# Altium integrated library HamedLib.IntLib: 365 symbols (part 3 of 3)
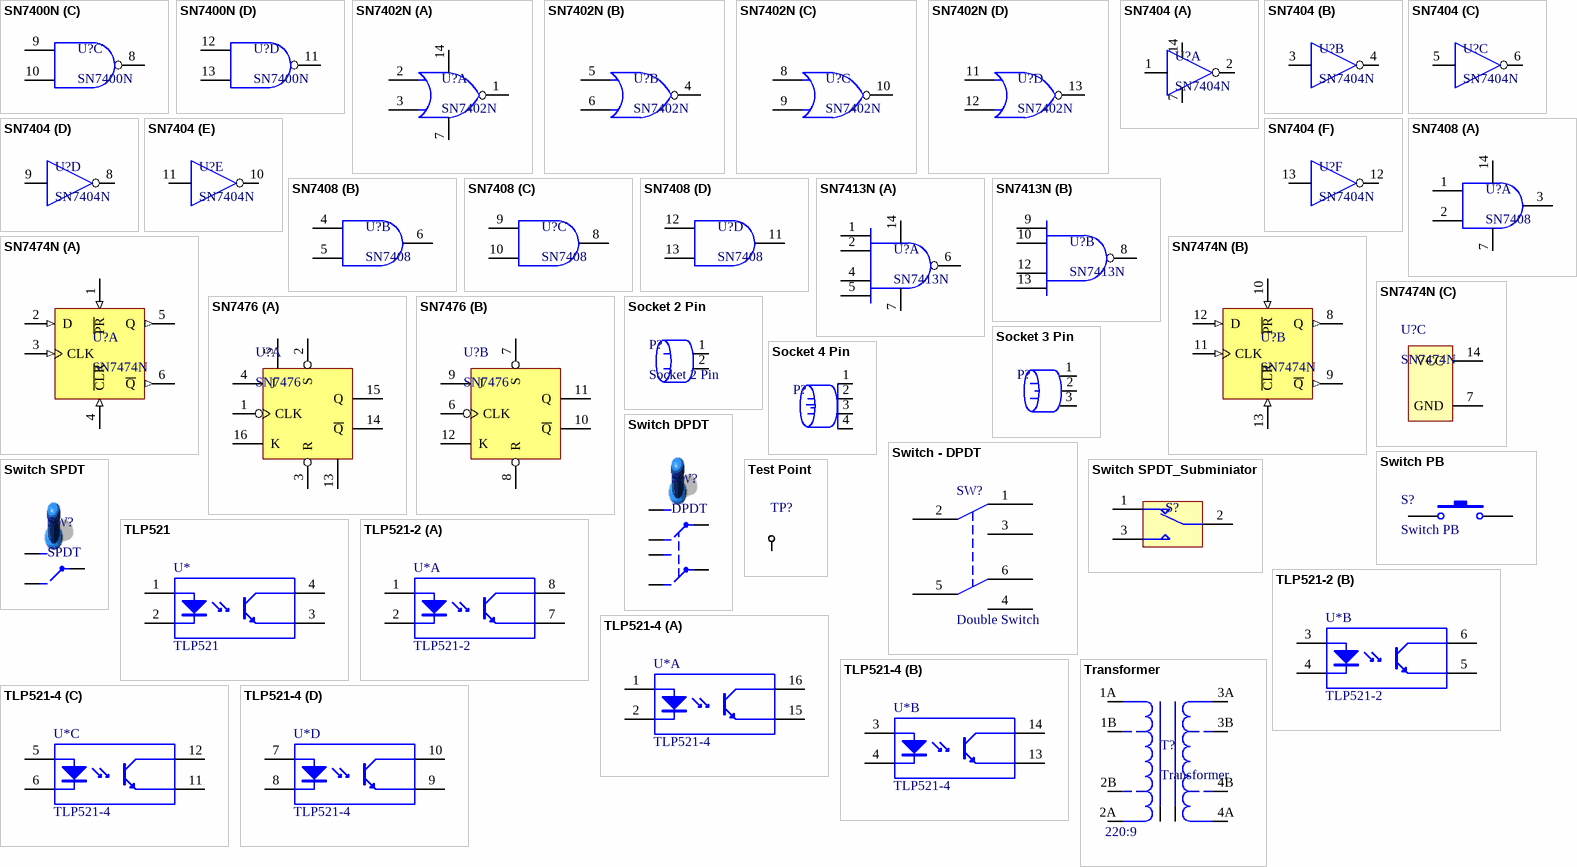
[diagram p20: symbols SN7400N to Transformer]

## SN7400N
designator U?
Quad 2 Input NAND Gate; Manufacturer: Texas Instrument; Designer: Saeid Jorablo; Company: ControTec; Adding date: 1387/12/22; ComponentLink1Description: DataSheet; ComponentLink1URL: *; Reversion: *
footprint DIP14
part A pins: 1, 2, 3, 7 GND (power), 14 VCC (power)
part B pins: 4, 5, 6
part C pins: 8, 9, 10
part D pins: 11, 12, 13

## SN7402N
designator U?
Quad 2 Input NOR Gate; Manufacturer: Texas Instrument; Designer: Saeid Jorablo; Company: ControTec; Adding Date: 1387/12/22; ComponentLink1Description: DataSheet; ComponentLink1URL: *
footprint DIP14
part A pins: 1, 2, 3, 7 GND, 14 VCC
part B pins: 4, 5, 6
part C pins: 8, 9, 10
part D pins: 11, 12, 13

## SN7404
designator U?, comment SN7404N
Hex Inverter; Manufactorer: Texas Instrument; Designer: Saeid Jorablo; Company: ControTec; Adding Date: 1387/12/22; ComponentLink1Description: Data Sheet; ComponentLink1URL: *
footprint dip14
part A pins: 1, 2, 7 GND (power), 14 VCC (power)
part B pins: 3, 4
part C pins: 5, 6
part D pins: 8, 9
part E pins: 10, 11
part F pins: 12, 13

## SN7408
designator U?
Quad 2 Input AND Gate; Designer: Saeid Jorablo; Company: ControTEK; Adding Date: 1387/01/10
footprint dip14
part A pins: 1, 2, 3, 7 GND (power), 14 VCC (power)
part B pins: 4, 5, 6
part C pins: 8, 9, 10
part D pins: 11, 12, 13

## SN7413N
designator U?
Dual 4 Input NAND Gate; Manufacturer: Texas Instrument; Designer: Saeid Jorablo; Company: ControTec; Adding Date: 1387/12/12; ComponentLink1Description: Data Sheet; ComponentLink1URL: *
footprint DIP14
part A pins: 1, 2, 4, 5, 6, 7 GND, 14 VCC
part B pins: 8, 9, 10, 12, 13

## SN7474N
designator U?
Dual D Flip Flop; Manufactorer: Texas Instrument; Designer: Saeid Jorablo; Company: ControTec; Adding Date: 1387/12/22; ComponentLink1Description: Data Sheet; ComponentLink1URL: *
footprint dip14
part A pins: 1 ~{PR} (in), 2 D (in), 3 CLK (in), 4 ~{CLR} (in), 5 Q (out), 6 ~{Q} (out)
part B pins: 8 Q (out), 9 ~{Q} (out), 10 ~{PR} (in), 11 CLK (in), 12 D (in), 13 ~{CLR} (in)
part C pins: 7 GND (power), 14 VCC (power)

## SN7476
designator U?
Dual J-K Flip Flop With Set & Reset; Designer: Saeid Jorablo; Company: ControTEK; Adding Date: 1387/01/10
footprint Dip16 (Footprint not found)
signal-integrity model SN7476 (Dual J-K Flip Flop)
part A pins: 1 CLK, 2 S, 3 R, 4 J, 5 VCC (power), 13 GND (power), 14 ~{Q}, 15 Q, 16 K
part B pins: 6 CLK, 7 S, 8 R, 9 J, 10 ~{Q}, 11 Q, 12 K

## Socket 2 Pin
designator P?
Power Input
footprint 2pin
pins: 1, 2

## Socket 3 Pin
designator P?  (value not drawn)
Power Input
footprint 3PIN
pins: 1, 2, 3

## Socket 4 Pin
designator P?  (value not drawn)
Power Input
footprint 4pin
pins: 1, 2, 3, 4

## Switch - DPDT
designator SW?, comment Double Switch
DPDT Switch
footprint Switch - DPDT
pins: 1, 2, 3, 4, 5, 6

## Switch DPDT
designator SW?, comment DPDT
DPDT Switch
footprint header 3x2
pins: 1, 2, 3, 4, 5, 6

## Switch PB
designator S?
Push Button Switch
footprint Switch - Push to On
footprint SW-PB
pins: 1, 2

## Switch SPDT
designator SW?, comment SPDT
SPDT Switch; Designer: Saeid Jorablo; Company: ControTEK; Adding Date: 1387/01/10
footprint SW SPDT- Horizontal
footprint Switch SPDT - 500x270x1100x185 mil
footprint Switch SPDT - 500x270x1100x185 mil - Right Angle
pins: 1, 2, 3

## Switch SPDT_Subminiator
designator S?  (value not drawn)
Subminiator SPDT Switch; Company: E.P.I.L; Design date: 2011/11/02
footprint SPDT Subminiator (Subminiator SPDT switch)
pins: 1, 2, 3

## Test Point
designator TP?  (value not drawn)
footprint Test Point
footprint Test Point Small
footprint Test_Pin
pins: 1 T

## TLP521
designator U*
HIGH DENSITY MOUNTING PHOTOTRANSISTOR OPTICALLY COUPLED ISOLATORS; Company: IPA Co.; Creator: Saeid Jorablo; Creation Date: 1387-1-26
pins: 1 A, 2 K, 3 E, 4 C

## TLP521-2
designator U*
HIGH DENSITY MOUNTING PHOTOTRANSISTOR OPTICALLY COUPLED ISOLATORS; Company: IPA CO.; Creator: Saeid Jorablo; Creation Date: 1387-1-26
footprint DIP8
part A pins: 1 A, 2 K, 7 E, 8 C
part B pins: 3 A, 4 K, 5 E, 6 C

## TLP521-4
designator U*
HIGH DENSITY MOUNTING PHOTOTRANSISTOR OPTICALLY COUPLED ISOLATORS; Company: IPA CO.; Creator: Saeid Jorablo; Creation Date: 1387-1-26; ComponentLink1Description: datasheet - pdf; ComponentLink1URL: *; ComponentLink2Description: appnote
footprint DIP16
part A pins: 1 A, 2 K, 15 E, 16 C
part B pins: 3 A, 4 K, 13 E, 14 C
part C pins: 5 A, 6 K, 11 E, 12 C
part D pins: 7 A, 8 K, 9 E, 10 C

## Transformer
designator T?  Voltage Ratio: 220:9
Designer: Eng. Saeid Jorablo; Company: DASE CO; Power: 100W; Adding Date: 10/27/2010
footprint Trans- Small
pins: 1A, 1B, 2A, 2B, 3A, 3B, 4A, 4B, SA, SB

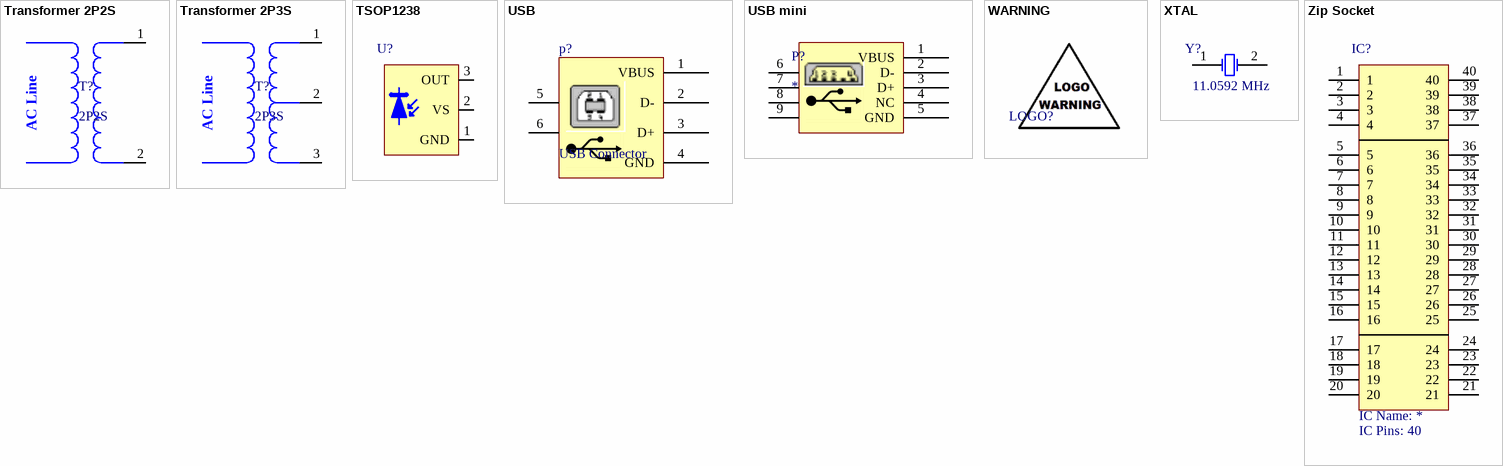
[diagram p13: symbols Transformer 2P2S to Zip Socket]

## Transformer 2P2S
designator T?, comment 2P2S
Transformer 2 Primary , 2 Secondry; Designer: Saeid jorablo; Company: ControTEK; Voltage Ratio: 220:9; Power: 100W; Adding Date: 1387/01/22
footprint Socket Blue 2
pins: 1, 2
text: AC Line

## Transformer 2P3S
designator T?, comment 2P3S
Transformer 2 Primary , 3 Secondry; Designer: Saeid Jorablo; Company: ControTEK; Voltage Ratio: 220:9; Power: 72W; Adding Date: 1387/01/22
footprint Socket Blue 3
pins: 1, 2, 3
text: AC Line

## TSOP1238
designator U?  (value not drawn)
Photo Modules for PCM Remote Control Systems; Frequency: 38 KHz; Designer: Saeid Jorablo; Company: IPA CO; Voltage: 5 V; Power: 50 mW; Adding Date: 1388/04/06
footprint TSOP1238 (IR Sensor (TV Sensor))
pins: 1 GND, 2 VS, 3 OUT

## USB
designator p?, comment USB Connector
USB Connector-B Type; Designer: Eng. Saeid Jorablo; Company: DASE Co; Adding Date: 10/26/2010
footprint USB2.5-2H4D (Connector; USB1.1, Type B, Thru-Hole; 4 Position; Right Angle)
footprint USB2.5-2H4E (Connector; USB1.1, Type B, Thru-Hole; 4 Position; Right Angle)
footprint USB2.5-2H4F (Connector; USB1.1, Type B, Thru-Hole; 4 Position; Right Angle)
footprint USB2.5-2H4G (Connector; USB1.1, Type B, Thru-Hole; 4 Position; Right Angle)
footprint USB2.5-2V4 (Connector; USB1.1, Type B, Thru-Hole; 4 Position; Vertical)
footprint USB2.5-4V4 (Connector; USB1.1, Type B, Thru-Hole; 4 Position; Vertical)
footprint USB/SM1.25-4H4 (Connector; USB1.1, Type B, SM; 4 Position; Right Angle)
pins: 1 VBUS (power), 2 D-, 3 D+, 4 GND (power), 5, 6

## USB mini
designator P?
mini USB Connector
footprint mini USB Connector
footprint SMD_Mini USB Connector
footprint USB/SM0.8-6H5 (Connector; USB2.0, Type B, SM; 5 Position; Right Angle)
pins: 1 VBUS (power), 2 D-, 3 D+, 4 NC (power), 5 GND (power), 6, 7, 8, 9

## WARNING
designator LOGO?, comment Warning!  (value not drawn)  (no BOM)
WARNING & LOGO; Company: E.P.I.L; Design Date: 11/6/2011; Value: Warning!
footprint LOGO SPEAKER
footprint LOGO USB
footprint WARNING
footprint WARNING ESD
footprint LOGO RESET
footprint LOGO Saeid

## XTAL
designator Y?, comment 11.0592 MHz
XTAL Crystal; Company: E.P.I.L; Design Date: 11/04/2011; Value: 11.0592 MHz
footprint Crystal SMD
footprint XTAL
footprint XTAL Small
footprint XTAL RTC
pins: 1 OSC1, 2 OSC2

## Zip Socket
designator IC?  IC Pins: 40  (hidden comment: Zip Socket)
40pin Zip/Zif Socket; Company: ECI CO.; Adding Date: 11/25/2011; IC Name: *
footprint DIP40 - Zip Socket
pins: 1, 2, 3, 4, 5, 6, 7, 8, 9, 10, 11, 12, 13, 14, 15, 16, 17, 18, 19, 20, 21, 22, 23, 24, 25, 26, 27, 28, 29, 30, 31, 32, 33, 34, 35, 36, 37, 38, 39, 40


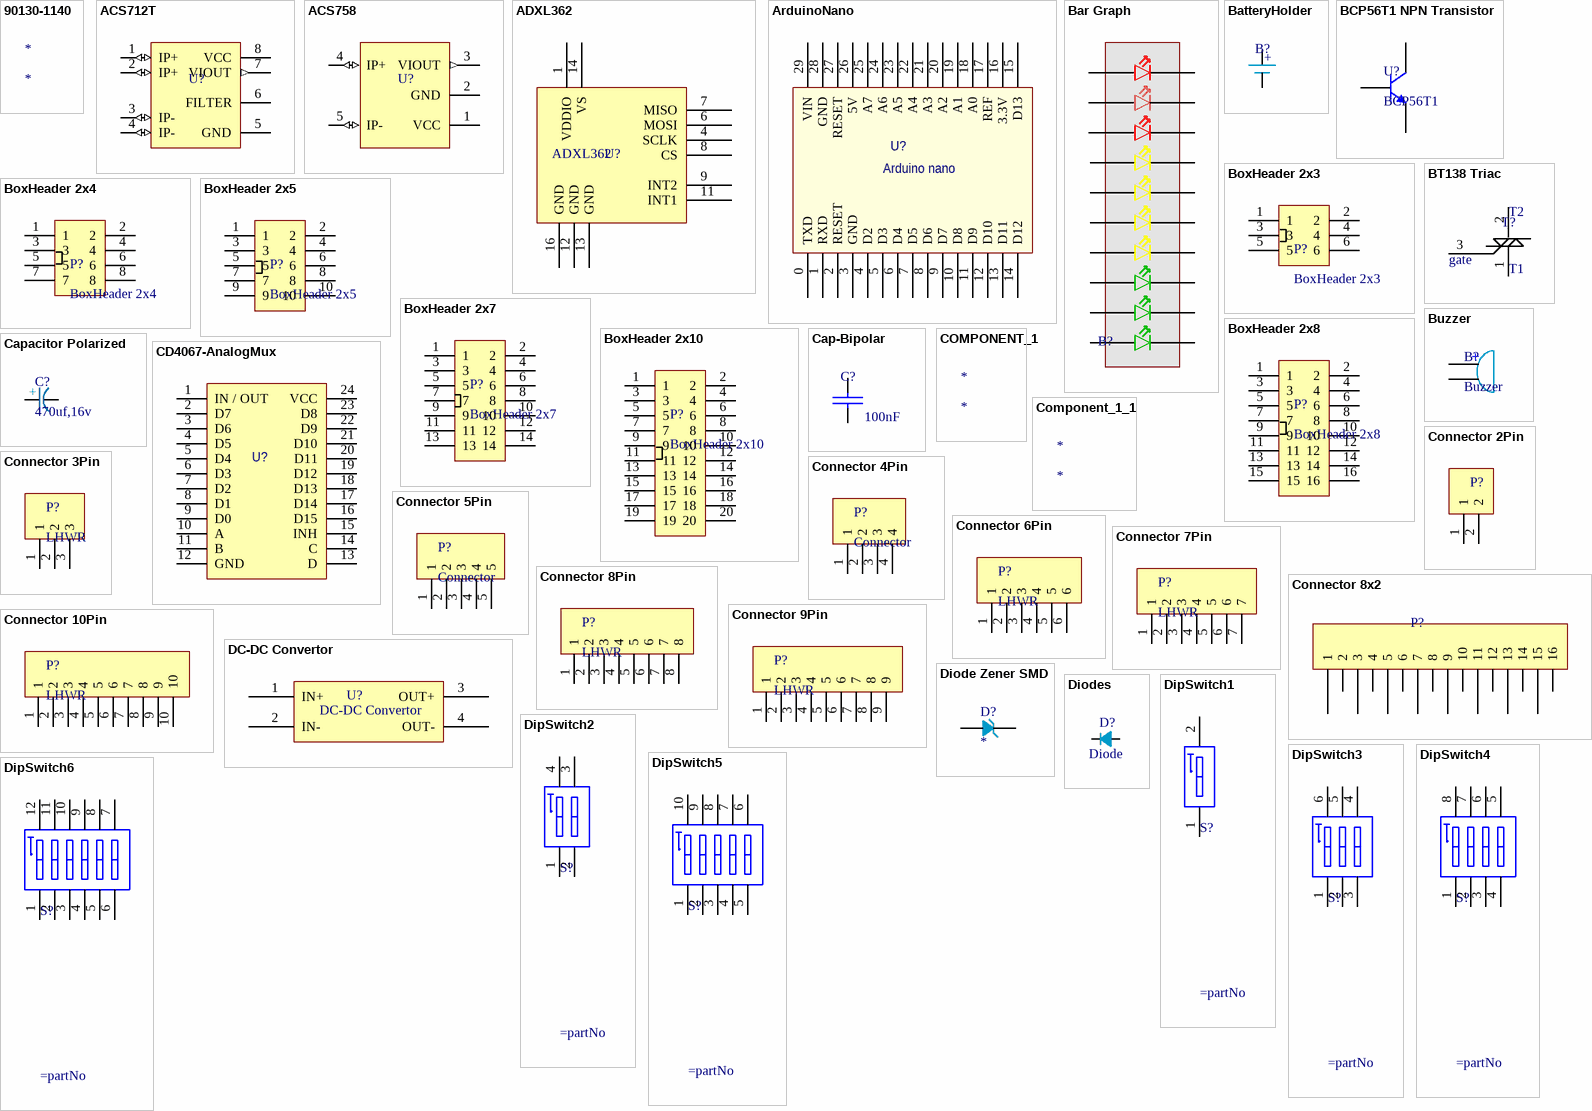
[diagram p14: symbols 90130-1140 to DipSwitch6]

## 90130-1140
designator *
Board Connector, 40 Contact(s), 2 Row(s), Male, Straight, 0.1 inch Pitch, Solder Terminal, Locking, Black Insulator, Receptacle; Manufacturer: Molex; Manufacturer Part Number: 90130-1140; Manufacturer Series: 90130; Option: General Purpose; Filter Feature: No; Number of Contacts: 40; Contact Pattern: RECTANGULAR; Dielectric Withstanding Voltage (AC): 700V; Insulation Resistance: 5GR; Number Of Connectors: 1; Number Of PCB Rows: 2; Rated Current (Signal): 3A; Contact Resistance: 20mR; Durability: 500Cycles; Contact Style: SQ PIN-SKT; Insertion Force-Max: 3.0024N; Body Breadth: 0.384inch; Body Depth: 0.515inch; PCB Contact Row Spacing: 2.54mm; Plating Thickness: 118uin; Body Length: 2.092inch; Reference Standard: UL; Reliability: COMMERCIAL; Supplier: Mouser; Supplier Part Number: 538-90130-1140; RoHS: Yes; Category: Headers and Wire Housings; Stock: 1491; Pricing: 1=3.06, 10=2.61, 50=2.28, 100=2.28, 1000=2.28, 10000=2.28 (USD); Mounting Technology: Board; Contact Finish - Mating: NOT SPECIFIED; Contact Material: Copper Alloy; Insulation Material: Glass; Insulation Color: Black; Min Operating Temperature: -55°C; Max Operating Temperature: 125°C; Connector Type: BOARD CONNECTOR; Contact Gender: Male; Mixed Contacts: No; Termination: Solder; Mounting Style: STRAIGHT; Number of Rows Loaded: 2; PCB Contact Pattern: RECTANGULAR; Body/Shell Style: RECEPTACLE; Mating Contact Pitch: 0.1inch; Terminal Pitch: 2.54mm; Mounting Option 1: LOCKING; Mating Contact Row Spacing: 0.1inch; Terminal Length: 0.114inch; Flammability Rating: UL94 V-0; DIN Conformance: No; IEC Conformance: No; MIL Conformance: No; Reach SVHC Compliant: Yes; RoHS Compliant: Yes; ComponentLink1URL: https://datasheet.ciiva.com:443/pdfs/VipMasterIC/IC/MOLE/MOLE-S-A0001360181/MOLE-S-A0001366101-1.pdf?src-supplier=IHS+Markit; ComponentLink1Description: https://datasheet.ciiva.com:443/pdfs/VipMasterIC/IC/MOLE/MOLE-S-A0001360181/MOLE-S-A0001366101-1.pdf?src-supplier=IHS+Markit; ComponentLink2URL: https://datasheet.ciiva.com/712/901301108-sd-712105.pdf?src-supplier=Digikey; ComponentLink2Description: https://datasheet.ciiva.com/712/901301108-sd-712105.pdf?src-supplier=Digikey; ComponentLink3URL: https://datasheet.ciiva.com/5155/0901301140-pcb-headers-151559-5155813.pdf?src-supplier=Mouser; ComponentLink3Description: https://datasheet.ciiva.com/5155/0901301140-pcb-headers-151559-5155813.pdf?src-supplier=Mouser; ComponentLink4URL: https://datasheet.ciiva.com/11752/0900766b80d6024d-11752755.pdf?src-supplier=Rs; ComponentLink4Description: https://datasheet.ciiva.com/11752/0900766b80d6024d-11752755.pdf?src-supplier=Rs; ComponentLink5URL: https://datasheet.ciiva.com/30129/0901301140-pcb-headers-30129574.pdf?src-supplier=Onlinecomponents.com; ComponentLink5Description: https://datasheet.ciiva.com/30129/0901301140-pcb-headers-30129574.pdf?src-supplier=Onlinecomponents.com; ComponentLink6URL: https://datasheet.ciiva.com/10072/0901301140-pcb-headers-10072277.pdf?src-supplier=Avnet; ComponentLink6Description: https://datasheet.ciiva.com/10072/0901301140-pcb-headers-10072277.pdf?src-supplier=Avnet

## ACS712T
designator U?  (value not drawn)
High-Precision Bidirectional Current sensor; Designer:: Hamed Jafarzadeh
footprint SOIC-8
pins: 1 IP+ (io) "Terminals for current being sampled; fused internally", 2 IP+ (io) "Terminals for current being sampled; fused internally", 3 IP- (io) "Terminals for current being sampled; fused internally", 4 IP- (io) "Terminals for current being sampled; fused internally", 5 GND (power) "Signal ground terminal", 6 FILTER "Terminal for external capacitor that sets bandwidth", 7 VIOUT (out) "Analog output signal", 8 VCC (power) "Device power supply terminal"

## ACS758
designator U?  (value not drawn)
High-Precision Bidirectional Current sensor; Designer:: Hamed Jafarzadeh
footprint ACS758
pins: 1 VCC (power) "Device power supply terminal", 2 GND (power) "Signal ground terminal", 3 VIOUT (out) "Analog output signal", 4 IP+ (io) "Terminals for current being sampled; fused internally", 5 IP- (io) "Terminals for current being sampled; fused internally"

## ADXL362
designator U?  (value not drawn)
footprint ADXL362
pins: 1 VDDIO, 4 SCLK, 6 MOSI, 7 MISO, 8 CS, 9 INT2, 11 INT1, 12 GND, 13 GND, 14 VS, 16 GND

## ArduinoNano
designator U?  (value not drawn)
footprint ArduinoNano
pins: 0 TXD, 1 RXD, 2 RESET, 3 GND, 4 D2, 5 D3, 6 D4, 7 D5, 8 D6, 9 D7, 10 D8, 11 D9, 12 D10, 13 D11, 14 D12, 15 D13, 16 3.3V, 17 REF, 18 A0, 19 A1, 20 A2, 21 A3, 22 A4, 23 A5, 24 A6, 25 A7, 26 5V, 27 RESET, 28 GND, 29 VIN
text: Arduino nano

## Bar Graph
designator B?  (value not drawn)
Designer: Farhoosh-Co.ir
footprint BarGraph (Bar Grph LED)
pins: 1, 2, 3, 4, 5, 6, 7, 8, 9, 10, 11, 12, 13, 14, 15, 16, 17, 18, 19, 20

## BatteryHolder
designator B?  (value not drawn)
footprint Battery Holder 2032
footprint Battery Holder CR1220-SMD
pins: 1, 2
text: +

## BCP56T1 NPN Transistor
designator U?, comment BCP56T1
footprint BCP56T1-SOT223
pins: 1 B, 2 C, 3 E

## BoxHeader 2x3
designator P?
Designer: HamedJafarzadeh - ww.R2T.ir
footprint Box Header 2x3
pins: 1, 2, 3, 4, 5, 6

## BoxHeader 2x4
designator P?
Designer: HamedJafarzadeh - ww.R2T.ir
footprint Box Header 2x4
pins: 1, 2, 3, 4, 5, 6, 7, 8

## BoxHeader 2x5
designator P?
Designer: HamedJafarzadeh - ww.R2T.ir
footprint Box Header 2x5
pins: 1, 2, 3, 4, 5, 6, 7, 8, 9, 10

## BoxHeader 2x7
designator P?
Designer: HamedJafarzadeh - ww.R2T.ir
footprint Box Header 2x7
pins: 1, 2, 3, 4, 5, 6, 7, 8, 9, 10, 11, 12, 13, 14

## BoxHeader 2x8
designator P?
Designer: HamedJafarzadeh - ww.R2T.ir
footprint Box Header 2x8
pins: 1, 2, 3, 4, 5, 6, 7, 8, 9, 10, 11, 12, 13, 14, 15, 16

## BoxHeader 2x10
designator P?
Designer: HamedJafarzadeh - ww.R2T.ir
footprint Box Header 2x10
pins: 1, 2, 3, 4, 5, 6, 7, 8, 9, 10, 11, 12, 13, 14, 15, 16, 17, 18, 19, 20

## BT138 Triac
designator T?  (value not drawn)
footprint BT138
pins: 1 T1, 2 T2, 3 GND
text: gate

## Buzzer
designator B?
Designer: Hamed Jafarzadeh
footprint Buzzer (Magnetic Transducer)
pins: 1 VCC, 2 GND
text: +

## Cap-Bipolar
designator C?, comment 100nF
Bipolar Capacitor; Voltage: 100V; Designer: Saeid Jorablo; Organazation: ControTec; Adding Date: 1387/12/20; Value: 100nF
footprint SMD_CAP_0603
footprint SMD_CAP_0805
footprint SMD_CAP_1206
pins: 1 +, 2 -

## Capacitor Polarized
designator C?, comment 470uf,16v
Designer: Hamed Jafarzadeh
footprint Electrolytic Capacitor SMD Dia-8 (470uf,6.3v,16v)
footprint Electrolytic Capacitor SMD Dia-8 - 100uf (100uf,6.3v,16v)
footprint Electrolytic Capacitor (5Rx5.3 - SMD C)
footprint Tantalum Cap Size D - 2917 (Tantalum 10uf,35v)
footprint Tantalum Cap Size A - 1206
footprint Tantalum Cap Size C - 2312
footprint Tantalum CAP Size E - 2917
footprint Tantalum Cap Size B - 1210
footprint WCAP-PSHP 8x7.7x3.1 (Polarized capacitors, Aluminum Polymer Capacitors, 2-Leads, Body 8x7.7x3.1)
footprint WCAP-PSHP 8x8.7x3.1 (Polarized capacitors, Aluminum Polymer Capacitors, 2-Leads, Body 8x8.7x3.1)
footprint WCAP-PSHP 10x8.7x4.5 (Polarized capacitors, Aluminum Polymer Capacitors, 2-Leads, Body 10x8.7x4.5)
footprint WCAP-PSHP 10x10.5x4.5 (Polarized capacitors, Aluminum Polymer Capacitors, 2-Leads, Body 10x10.5x4.5)
footprint CAPE R2.25 Flat
footprint CAPE R3.5
footprint CAPE R3.5 Flat
footprint CAPE R5.0
footprint CAPE R16.00 HV
footprint CAPE R18.00 HV
footprint CAP ALSMD 5.3MM H5.4MM (Aluminum Electrolytic Capacitor, Body 5.30x5.30x5.40mm, IPC Low Density)
pins: 1, 2
text: +

## CD4067-AnalogMux
designator U?  (value not drawn)
footprint CD474HC4067
footprint SOP65P640X120-24N
pins: 1 IN / OUT, 2 D7, 3 D6, 4 D5, 5 D4, 6 D3, 7 D2, 8 D1, 9 D0, 10 A, 11 B, 12 GND, 13 D, 14 C, 15 INH, 16 D15, 17 D14, 18 D13, 19 D12, 20 D11, 21 D10, 22 D9, 23 D8, 24 VCC

## COMPONENT_1
designator *

## Component_1_1
designator *

## Connector 2Pin
designator P?, comment Connector  (value not drawn)
Designer:: Hamed Jafarzadeh - www.R2T.ir
footprint Polarized Header 2
footprint Terminal Block 2pin
footprint Phoenix 2pin ST (-)
footprint PH Connector 2Pin
footprint KF350-2p (-)
pins: 1, 2

## Connector 3Pin
designator P?, comment LHWR
Designer:: Hamed Jafarzadeh - www.R2T.ir
footprint Polarized Header 3
footprint Terminal Block 3Pin
footprint Phoenix 3pin ST (-)
footprint PH Connector 3Pin
footprint KF350-3p (-)
pins: 1, 2, 3

## Connector 4Pin
designator P?, comment Connector
Designer:: Hamed Jafarzadeh - www.R2T.ir
footprint Polarized Header 4
footprint Phoenix 4pin ST (-)
footprint PH 4A Connector
pins: 1, 2, 3, 4

## Connector 5Pin
designator P?, comment Connector
Designer:: Hamed Jafarzadeh - www.R2T.ir
footprint Polarized Header 5
footprint Phoenix 5pin ST (-)
footprint PH Connector 5Pin
pins: 1, 2, 3, 4, 5

## Connector 6Pin
designator P?, comment LHWR
Designer:: Hamed Jafarzadeh - www.R2T.ir
footprint Polarized Header 6
footprint PH Connector 6Pin
pins: 1, 2, 3, 4, 5, 6

## Connector 7Pin
designator P?, comment LHWR
Designer:: Hamed Jafarzadeh - www.R2T.ir
footprint Polarized Header 7
footprint PH Connector 7Pin
pins: 1, 2, 3, 4, 5, 6, 7

## Connector 8Pin
designator P?, comment LHWR
Designer:: Hamed Jafarzadeh - www.R2T.ir
footprint PH Connector 8Pin (Male Vertical Shrouded Header - 08p 1 row)
footprint Phoenix 8 Pin ST (-)
pins: 1, 2, 3, 4, 5, 6, 7, 8

## Connector 8x2
designator P?  (value not drawn)
footprint Connector ATX 16pin 4.2MM Pitch
pins: 1, 2, 3, 4, 5, 6, 7, 8, 9, 10, 11, 12, 13, 14, 15, 16

## Connector 9Pin
designator P?, comment LHWR
Designer:: Hamed Jafarzadeh - www.R2T.ir
footprint PH Connector 9Pin (Male Vertical Shrouded Header - 09p 1 row)
pins: 1, 2, 3, 4, 5, 6, 7, 8, 9

## Connector 10Pin
designator P?, comment LHWR
Designer:: Hamed Jafarzadeh - www.R2T.ir
footprint PH Connector 10Pin (Male Vertical Shrouded Header - 10p 1 row)
pins: 1, 2, 3, 4, 5, 6, 7, 8, 9, 10

## DC-DC Convertor
designator U?  (value not drawn)
footprint DC-DC 12A
pins: 1 IN+, 2 IN-, 3 OUT+, 4 OUT-

## Diode Zener SMD
designator D?
Designer: Hamed Jafarzadeh
footprint DIOMELF3615N (MELF Diode, 2-Leads, Body 3.6x1.5mm, IPC Medium Density)
footprint Diode Zener 1W SMD-SOD106 (MELF Diode, 2-Leads, Body 3.6x1.5mm, IPC Medium Density)
pins: 1, 2

## Diodes
designator D?  Description:: Diode  (hidden comment: *)
Designer :: Hamed Jafarzadeh
footprint DO-214AC ( SMD Diode )
footprint SMB-CASE 403-A03 (Molded Diode,MURS120T)
footprint DO-201 (1n5822 Through Hole)
footprint DO-201 Vertical (1n5822 Through Hole)
pins: 0, 1

## DipSwitch1
designator S?
WS-DITV 2.54 mm compact THT with flat actuator; Manufacturer: Wurth Elektronik; Part No.: 418117170901; ComponentLink1 Description: Manufacturer; ComponentLink2 Description: Datasheet; Pole: 01; Created Date: Dec.2015; ComponentLink1URL: http://www.we-online.com; ComponentLink2URL: http://katalog.we-online.de/em/datasheet/4181171709xx.pdf; Created by: Baojun Chen
footprint 418117170901 (01p, 2.54mm Pitch, Horizontal, Box Type, THT, flat Actuator, red, without Tape, Tube)
pins: 1, 2

## DipSwitch2
designator S?
WS-DITV 2.54 mm compact THT with flat actuator; Manufacturer: Wurth Elektronik; Part No.: 418117170902; ComponentLink1 Description: Manufacturer; ComponentLink2 Description: Datasheet; Pole: 02; Created Date: Dec.2015; ComponentLink1URL: http://www.we-online.com; ComponentLink2URL: http://katalog.we-online.de/em/datasheet/4181171709xx.pdf; Created by: Baojun Chen
footprint 418117170902 (02p, 2.54mm Pitch, Horizontal, Box Type, THT, flat Actuator, red, without Tape, Tube)
pins: 1, 2, 3, 4

## DipSwitch3
designator S?
WS-DITV 2.54 mm compact THT with flat actuator; Manufacturer: Wurth Elektronik; Part No.: 418117170903; ComponentLink1 Description: Manufacturer; ComponentLink2 Description: Datasheet; Pole: 03; Created Date: Dec.2015; ComponentLink1URL: http://www.we-online.com; ComponentLink2URL: http://katalog.we-online.de/em/datasheet/4181171709xx.pdf; Created by: Baojun Chen
footprint 418117170903 (03p, 2.54mm Pitch, Horizontal, Box Type, THT, flat Actuator, red, without Tape, Tube)
pins: 1, 2, 3, 4, 5, 6

## DipSwitch4
designator S?
WS-DITV 2.54 mm compact THT with flat actuator; Manufacturer: Wurth Elektronik; Part No.: 418117170904; ComponentLink1 Description: Manufacturer; ComponentLink2 Description: Datasheet; Pole: 04; Created Date: Dec.2015; ComponentLink1URL: http://www.we-online.com; ComponentLink2URL: http://katalog.we-online.de/em/datasheet/4181171709xx.pdf; Created by: Baojun Chen
footprint 418117170904 (04p, 2.54mm Pitch, Horizontal, Box Type, THT, flat Actuator, red, without Tape, Tube)
pins: 1, 2, 3, 4, 5, 6, 7, 8

## DipSwitch5
designator S?
WS-DITV 2.54 mm compact THT with flat actuator; Manufacturer: Wurth Elektronik; Part No.: 418117170905; ComponentLink1 Description: Manufacturer; ComponentLink2 Description: Datasheet; Pole: 05; Created Date: Dec.2015; ComponentLink1URL: http://www.we-online.com; ComponentLink2URL: http://katalog.we-online.de/em/datasheet/4181171709xx.pdf; Created by: Baojun Chen
footprint 418117170905 (05p, 2.54mm Pitch, Horizontal, Box Type, THT, flat Actuator, red, without Tape, Tube)
pins: 1, 2, 3, 4, 5, 6, 7, 8, 9, 10

## DipSwitch6
designator S?
WS-DITV 2.54 mm compact THT with flat actuator; Manufacturer: Wurth Elektronik; Part No.: 418117170906; ComponentLink1 Description: Manufacturer; ComponentLink2 Description: Datasheet; Pole: 06; Created Date: Dec.2015; ComponentLink1URL: http://www.we-online.com; ComponentLink2URL: http://katalog.we-online.de/em/datasheet/4181171709xx.pdf; Created by: Baojun Chen
footprint 418117170906 (06p, 2.54mm Pitch, Horizontal, Box Type, THT, flat Actuator, red, without Tape, Tube)
pins: 1, 2, 3, 4, 5, 6, 7, 8, 9, 10, 11, 12

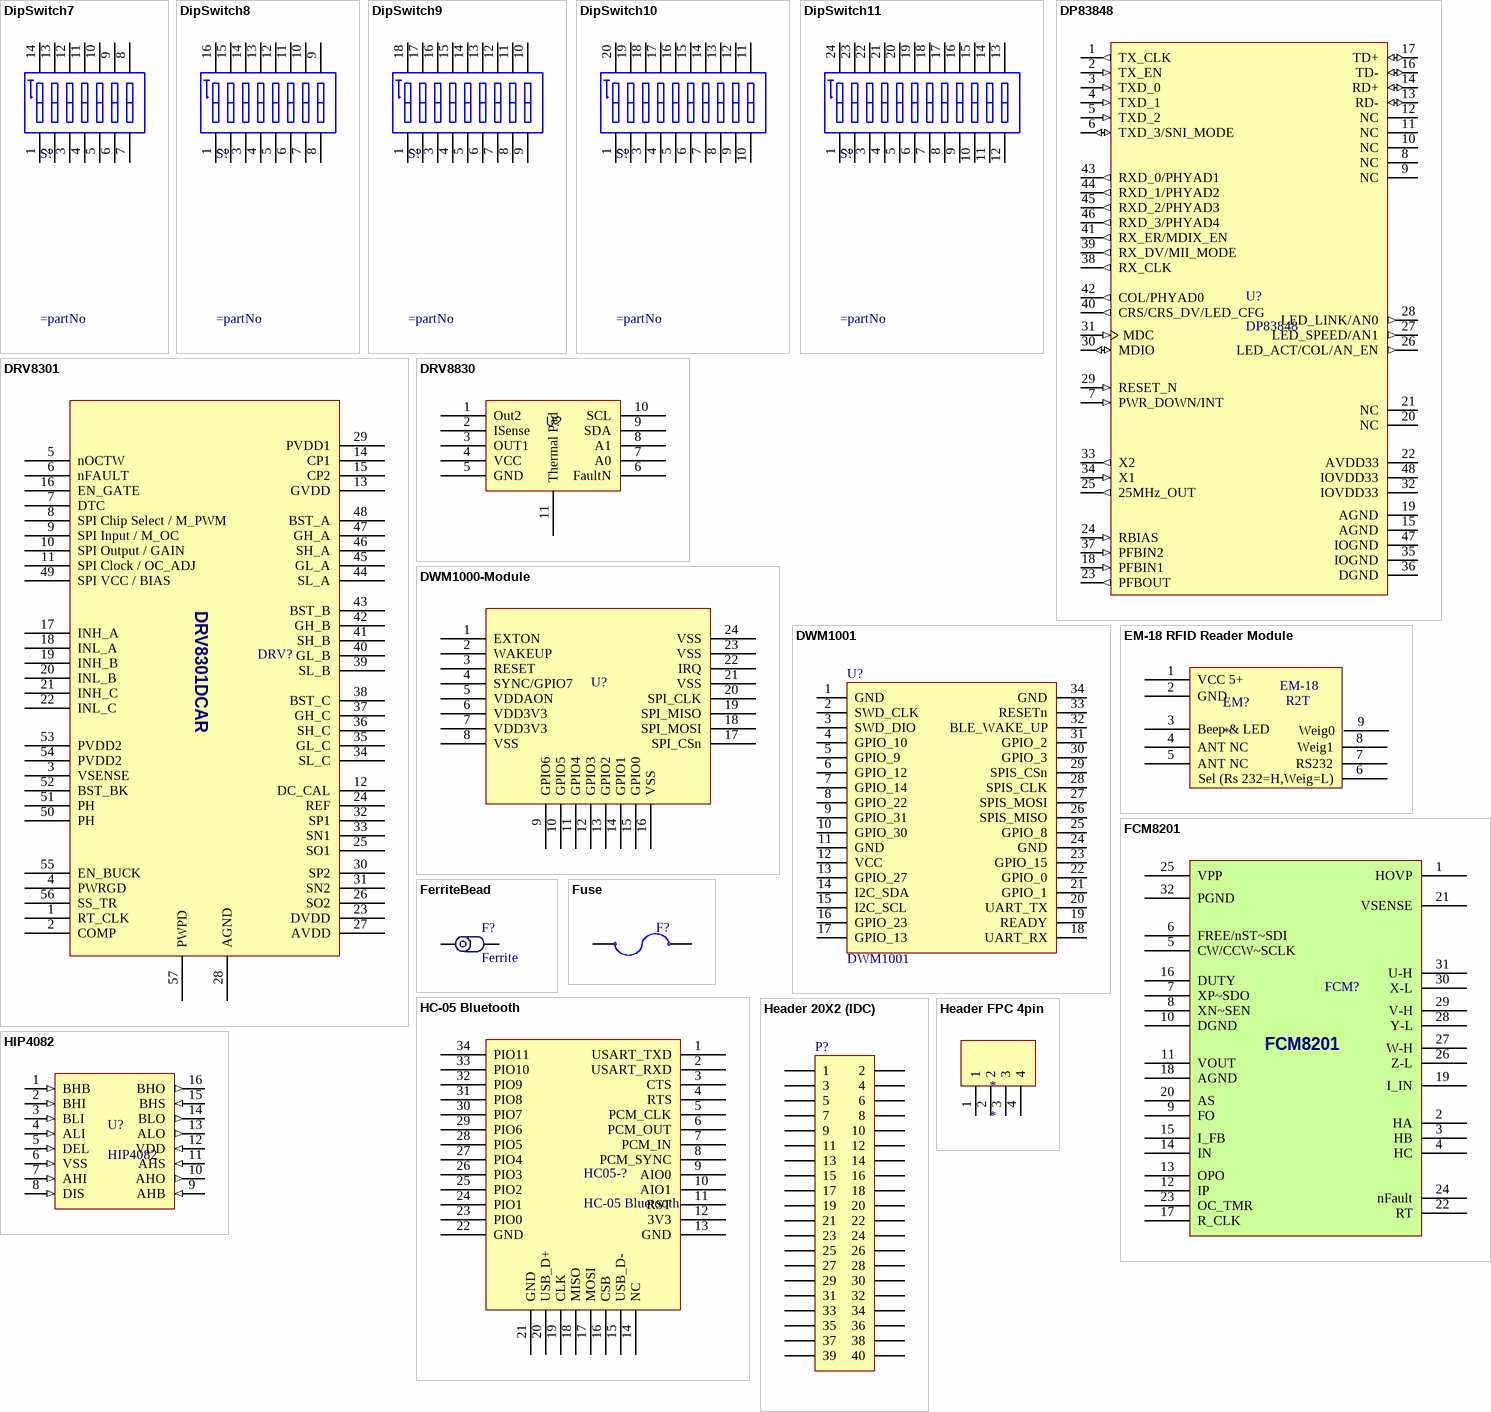
[diagram p15: symbols DipSwitch7 to HIP4082]

## DipSwitch7
designator S?
WS-DITV 2.54 mm compact THT with flat actuator; Manufacturer: Wurth Elektronik; Part No.: 418117170907; ComponentLink1 Description: Manufacturer; ComponentLink2 Description: Datasheet; Pole: 07; Created Date: Dec.2015; ComponentLink1URL: http://www.we-online.com; ComponentLink2URL: http://katalog.we-online.de/em/datasheet/4181171709xx.pdf; Created by: Baojun Chen
footprint 418117170907 (07p, 2.54mm Pitch, Horizontal, Box Type, THT, flat Actuator, red, without Tape, Tube)
pins: 1, 2, 3, 4, 5, 6, 7, 8, 9, 10, 11, 12, 13, 14

## DipSwitch8
designator S?
WS-DITV 2.54 mm compact THT with flat actuator; Manufacturer: Wurth Elektronik; Part No.: 418117170908; ComponentLink1 Description: Manufacturer; ComponentLink2 Description: Datasheet; Pole: 08; Created Date: Dec.2015; ComponentLink1URL: http://www.we-online.com; ComponentLink2URL: http://katalog.we-online.de/em/datasheet/4181171709xx.pdf; Created by: Baojun Chen
footprint 418117170908 (08p, 2.54mm Pitch, Horizontal, Box Type, THT, flat Actuator, red, without Tape, Tube)
pins: 1, 2, 3, 4, 5, 6, 7, 8, 9, 10, 11, 12, 13, 14, 15, 16

## DipSwitch9
designator S?
WS-DITV 2.54 mm compact THT with flat actuator; Manufacturer: Wurth Elektronik; Part No.: 418117170909; ComponentLink1 Description: Manufacturer; ComponentLink2 Description: Datasheet; Pole: 09; Created Date: Dec.2015; ComponentLink1URL: http://www.we-online.com; ComponentLink2URL: http://katalog.we-online.de/em/datasheet/4181171709xx.pdf; Created by: Baojun Chen
footprint 418117170909 (09p, 2.54mm Pitch, Horizontal, Box Type, THT, flat Actuator, red, without Tape, Tube)
pins: 1, 2, 3, 4, 5, 6, 7, 8, 9, 10, 11, 12, 13, 14, 15, 16, 17, 18

## DipSwitch10
designator S?
WS-DITV 2.54 mm compact THT with flat actuator; Manufacturer: Wurth Elektronik; Part No.: 418117170910; ComponentLink1 Description: Manufacturer; ComponentLink2 Description: Datasheet; Pole: 10; Created Date: Dec.2015; ComponentLink1URL: http://www.we-online.com; ComponentLink2URL: http://katalog.we-online.de/em/datasheet/4181171709xx.pdf; Created by: Baojun Chen
footprint 418117170910 (10p, 2.54mm Pitch, Horizontal, Box Type, THT, flat Actuator, red, without Tape, Tube)
pins: 1, 2, 3, 4, 5, 6, 7, 8, 9, 10, 11, 12, 13, 14, 15, 16, 17, 18, 19, 20

## DipSwitch11
designator S?
WS-DITV 2.54 mm compact THT with flat actuator; Manufacturer: Wurth Elektronik; Part No.: 418117170912; ComponentLink1 Description: Manufacturer; ComponentLink2 Description: Datasheet; Pole: 12; Created Date: Dec.2015; ComponentLink1URL: http://www.we-online.com; ComponentLink2URL: http://katalog.we-online.de/em/datasheet/4181171709xx.pdf; Created by: Baojun Chen
footprint 418117170912 (12p, 2.54mm Pitch, Horizontal, Box Type, THT, flat Actuator, red, without Tape, Tube)
pins: 1, 2, 3, 4, 5, 6, 7, 8, 9, 10, 11, 12, 13, 14, 15, 16, 17, 18, 19, 20, 21, 22, 23, 24

## DP83848
designator U?
Designer:: Hamed Jafarzadeh
footprint DP83848_LQFP48 (Thin QFP, 48-Leads, Body 7x7mm, Pitch 0.5mm, IPC Medium Density)
pins: 1 TX_CLK (out), 2 TX_EN (in), 3 TXD_0 (in), 4 TXD_1 (in), 5 TXD_2 (in), 6 TXD_3/SNI_MODE (io), 7 PWR_DOWN/INT (in), 8 NC (oc), 9 NC (oc), 10 NC (oc), 11 NC (oc), 12 NC (oc), 13 RD- (io), 14 RD+ (io), 15 AGND (power), 16 TD- (io), 17 TD+ (io), 18 PFBIN1 (in), 19 AGND (power), 20 NC (oc), 21 NC (oc), 22 AVDD33 (power), 23 PFBOUT (out), 24 RBIAS (in), 25 25MHz_OUT (out), 26 LED_ACT/COL/AN_EN (out), 27 LED_SPEED/AN1 (out), 28 LED_LINK/AN0 (out), 29 RESET_N (in), 30 MDIO (io), 31 MDC (in), 32 IOVDD33 (power), 33 X2 (out), 34 X1 (in), 35 IOGND (power), 36 DGND (power), 37 PFBIN2 (in), 38 RX_CLK (out), 39 RX_DV/MII_MODE (out), 40 CRS/CRS_DV/LED_CFG (out), 41 RX_ER/MDIX_EN (out), 42 COL/PHYAD0 (out), 43 RXD_0/PHYAD1 (out), 44 RXD_1/PHYAD2 (out), 45 RXD_2/PHYAD3 (out), 46 RXD_3/PHYAD4 (out), 47 IOGND (power), 48 IOVDD33 (power)

## DRV8301
designator DRV?  (value not drawn)
Three Phase Brushless Pre-Driver; Design By: Hamed Jafarzadeh - WWW.R2T.IR
footprint TSSOP50P810X120_HS-57N (TSSOP, 56-Leads, Body 14.00x6.10mm, Pitch 0.50mm, Thermal Pad 6.35.2x3.61.2mm, IPC Medium Density)
pins: 1 RT_CLK, 2 COMP, 3 VSENSE, 4 PWRGD, 5 nOCTW, 6 nFAULT, 7 DTC, 8 SPI Chip Select / M_PWM, 9 SPI Input / M_OC, 10 SPI Output / GAIN, 11 SPI Clock / OC_ADJ, 12 DC_CAL, 13 GVDD, 14 CP1, 15 CP2, 16 EN_GATE, 17 INH_A, 18 INL_A, 19 INH_B, 20 INL_B, 21 INH_C, 22 INL_C, 23 DVDD, 24 REF, 25 SO1, 26 SO2, 27 AVDD, 28 AGND, 29 PVDD1, 30 SP2, 31 SN2, 32 SP1, 33 SN1, 34 SL_C, 35 GL_C, 36 SH_C, 37 GH_C, 38 BST_C, 39 SL_B, 40 GL_B, 41 SH_B, 42 GH_B, 43 BST_B, 44 SL_A, 45 GL_A, 46 SH_A, 47 GH_A, 48 BST_A, 49 SPI VCC / BIAS, 50 PH, 51 PH, 52 BST_BK, 53 PVDD2, 54 PVDD2, 55 EN_BUCK, 56 SS_TR, 57 PWPD
text: DRV8301DCAR
